# Altium footprint library HubProModel_v1.PcbLib: 67 footprints (part 4 of 5)
Each footprint in its own frame and in the unit in brackets; x right, y up, seen from the top. Pads: shape width x height; smd on the part's side, far side on the other; paste and mask are expansions set on the pad; w line width, h text height; cw(c..) or ccw(c..) is an arc to the next point about the centre after c.
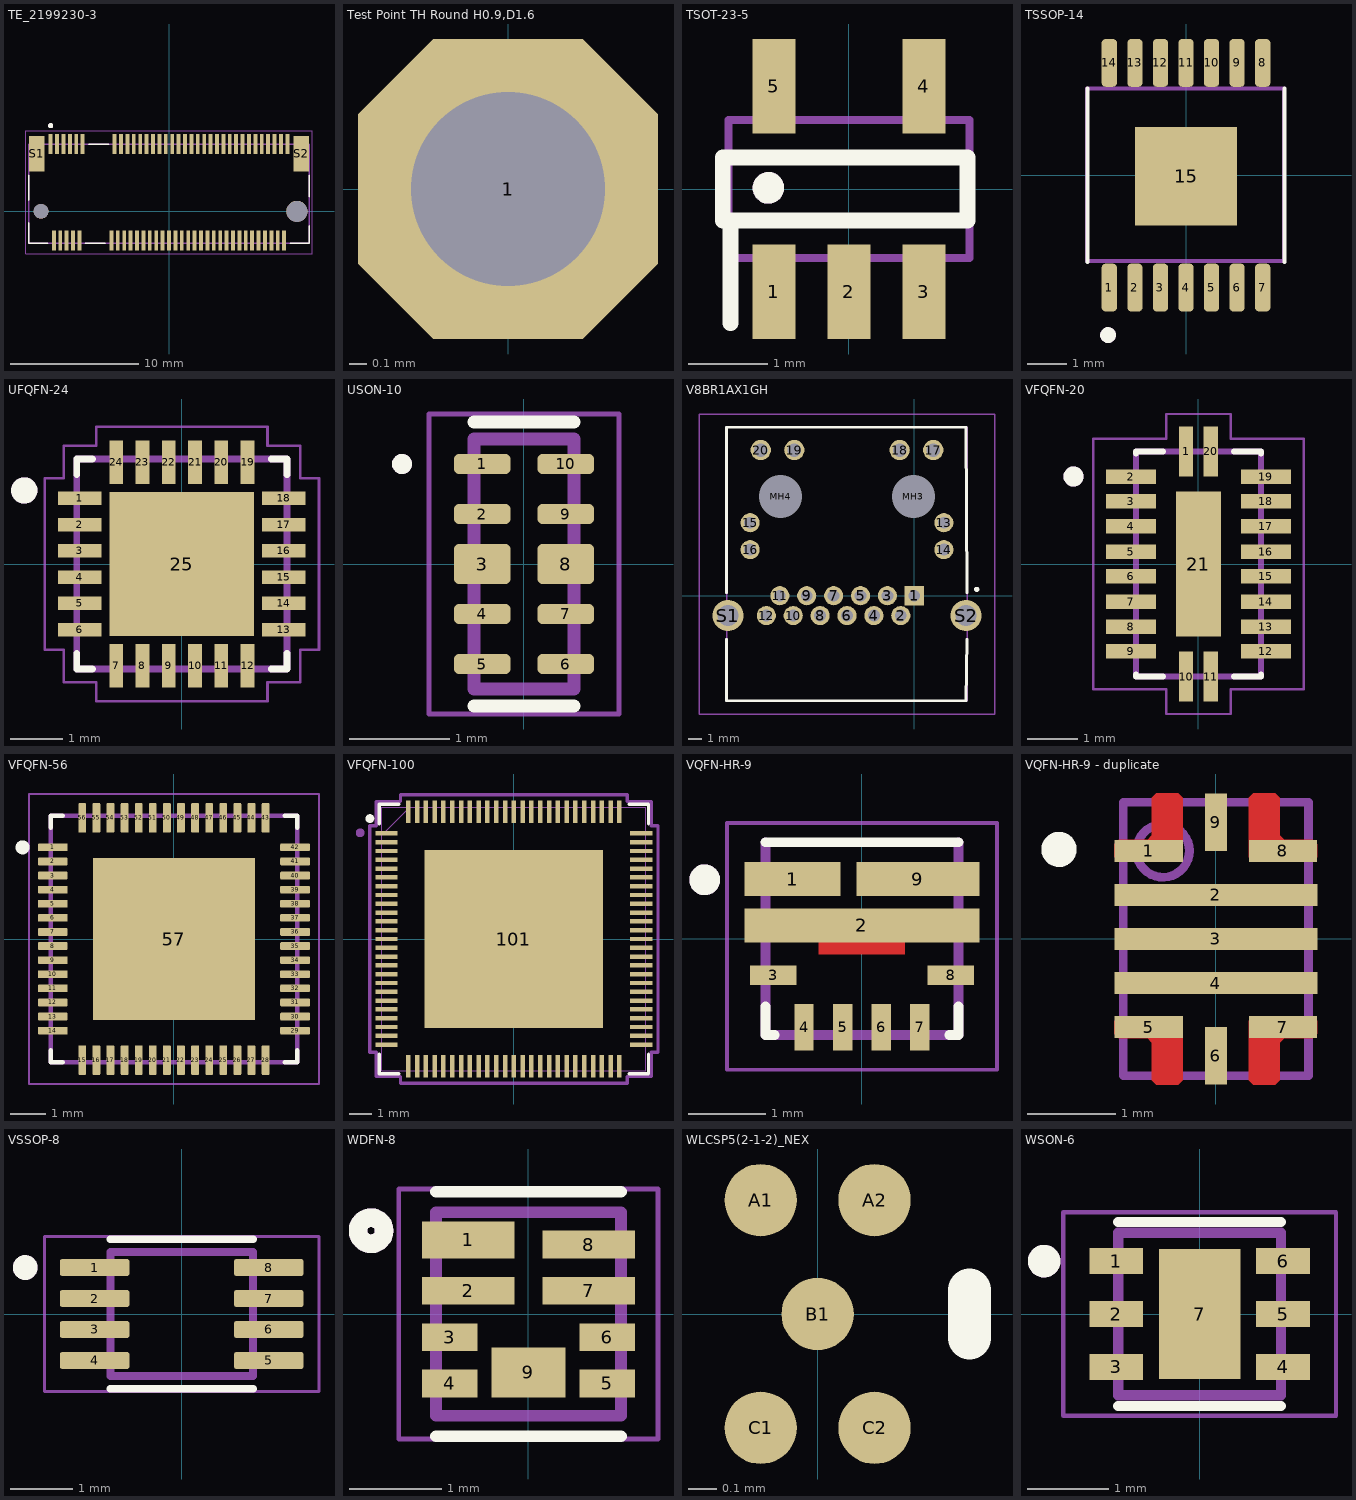
[diagram p3: the footprints below, top view; thin cyan lines are the x and y axes]

## TE_2199230-3 [mm] "M.2 0.5PITCH 4.2H KEY B 15U'' AU"
pads (71):
  rect 0.3x1.55 smd: 1(-9.25,5.275) 2(-9,-2.275) 3(-8.75,5.275) 4(-8.5,-2.275) 5(-8.25,5.275) 6(-8,-2.275) 7(-7.75,5.275) 8(-7.5,-2.275) 9(-7.25,5.275) 10(-7,-2.275) 11(-6.75,5.275) 20(-4.5,-2.275) 21(-4.25,5.275) 22(-4,-2.275) 23(-3.75,5.275) 24(-3.5,-2.275) 25(-3.25,5.275) 26(-3,-2.275) 27(-2.75,5.275) 28(-2.5,-2.275) 29(-2.25,5.275) 30(-2,-2.275) 31(-1.75,5.275) 32(-1.5,-2.275) 33(-1.25,5.275) 34(-1,-2.275) 35(-0.75,5.275) 36(-0.5,-2.275) 37(-0.25,5.275) 38(0,-2.275) 39(0.25,5.275) 40(0.5,-2.275) 41(0.75,5.275) 42(1,-2.275) 43(1.25,5.275) 44(1.5,-2.275) 45(1.75,5.275) 46(2,-2.275) 47(2.25,5.275) 48(2.5,-2.275) 49(2.75,5.275) 50(3,-2.275) 51(3.25,5.275) 52(3.5,-2.275) 53(3.75,5.275) 54(4,-2.275) 55(4.25,5.275) 56(4.5,-2.275) 57(4.75,5.275) 58(5,-2.275) 59(5.25,5.275) 60(5.5,-2.275) 61(5.75,5.275) 62(6,-2.275) 63(6.25,5.275) 64(6.5,-2.275) 65(6.75,5.275) 66(7,-2.275) 67(7.25,5.275) 68(7.5,-2.275) 69(7.75,5.275) 70(8,-2.275) 71(8.25,5.275) 72(8.5,-2.275) 73(8.75,5.275) 74(9,-2.275) 75(9.25,5.275)
  rect 1.2x2.75 smd: S1(-10.35,4.5) S2(10.35,4.5)
  round 1.15 hole 1.15 unplated: ""(-10,0)
  round 1.65 hole 1.65 unplated: ""(10,0)
Top Overlay:
  circle w0.2: c-9.25,6.7 r0.1
  lines w0.127: -10.95,-0.895 -10.95,-2.5 -9.47,-2.5 ; -10.95,0.895 -10.95,2.805 ; -6.53,-2.5 -4.97,-2.5 ; -6.28,5.25 -4.72,5.25 ; 9.47,-2.5 10.95,-2.5 10.95,-1.145 ; 10.95,1.145 10.95,2.805
Mechanical 13:
  circle w0.2: c-9.25,6.7 r0.1
  lines w0.127: -10.95,-2.5 10.95,-2.5 10.95,5.25 -10.95,5.25 -10.95,-2.5
Mechanical 15:
  lines w0.05: -11.2,-3.3 11.2,-3.3 11.2,6.3 -11.2,6.3 -11.2,-3.3

## Test Point TH Round H0.9,D1.6 [mm]
pads (1):
  oct 1.7x1.7 hole 1.1: 1(0,0)

## TSOT-23-5 [mm] "Buck Switching Regulator IC Positive Adjustable 0.6V 1 Output 700mA SOT-23-5 Thin, TSOT-23-5"
pads (5):
  rect 0.55x1.2 smd: 1(-0.95,-1.3) 2(0,-1.3) 3(0.95,-1.3) 4(0.95,1.3) 5(-0.95,1.3)
Top Overlay:
  circle w0.2: c-1.021,0.015 r0.1
  lines w0.2: -1.5,-1.7 -1.5,-0.4 ; -1.5,-0.4 1.5,-0.4 1.5,0.4 -1.6,0.4 -1.6,-0.4 -1.5,-0.4
Mechanical 13:
  circle w0.2: c-1.021,0.015 r0.1
  region: -0.7,-1.5 -1.2,-1.5 -1.2,-0.85 -0.7,-0.85
  region: 0.25,-1.5 -0.25,-1.5 -0.25,-0.85 0.25,-0.85
  region: 1.2,-1.5 0.7,-1.5 0.7,-0.85 1.2,-0.85
  region: 1.2,0.85 0.7,0.85 0.7,1.5 1.2,1.5
  region: -0.7,0.85 -1.2,0.85 -1.2,1.5 -0.7,1.5
  lines w0.1: -1.525,-0.875 1.525,-0.875 1.525,0.875 -1.525,0.875 -1.525,-0.875

## TSSOP-14 [mm] "Buck Switching Regulator IC Positive Adjustable 0.6V 1 Output 3A 14-TSSOP (0.173\", 4.40mm Width) Exposed Pad"
height 0.89
pads (15):
  rrect50% 0.387x1.215 smd: 1(-1.95,-2.857) 2(-1.3,-2.857) 3(-0.65,-2.857) 4(0,-2.857) 5(0.65,-2.857) 6(1.3,-2.857) 7(1.95,-2.857) 8(1.95,2.857) 9(1.3,2.857) 10(0.65,2.857) 11(0,2.857) 12(-0.65,2.857) 13(-1.3,2.857) 14(-1.95,2.857)
  rect 2.6x2.5 smd: 15(0,-0.025)
Top Overlay:
  circle w0.2: c-1.981,-4.064 r0.1
  lines w0.102: -2.5,-2.2 -2.5,2.2 ; 2.5,-2.2 2.5,2.2
Mechanical 1:
  circle w0.2: c-1.981,-4.064 r0.1
  lines w0.102: -2.515,-2.184 -2.515,2.21 2.489,2.21 2.489,-2.184 -2.515,-2.184

## UFQFN-24 [mm] "High Speed/Super Speed Type-C DRP Port Controller 3.3V/5V Tray 24-Pin QFN EP"
pads (25):
  rect 0.83x0.26 smd: 1(-1.94,1.25) 2(-1.94,0.75) 3(-1.94,0.25) 4(-1.94,-0.25) 5(-1.94,-0.75) 6(-1.94,-1.25) 13(1.94,-1.25) 14(1.94,-0.75) 15(1.94,-0.25) 16(1.94,0.25) 17(1.94,0.75) 18(1.94,1.25)
  rect 0.26x0.83 smd: 7(-1.25,-1.94) 8(-0.75,-1.94) 9(-0.25,-1.94) 10(0.25,-1.94) 11(0.75,-1.94) 12(1.25,-1.94) 19(1.25,1.94) 20(0.75,1.94) 21(0.25,1.94) 22(-0.25,1.94) 23(-0.75,1.94) 24(-1.25,1.94)
  rect 2.75x2.75 smd paste-2: 25(0,0)
Top Overlay:
  circle w0.3: c-3,1.4 r0.1
  lines w0.127: -2,-1.7 -2,-2 -1.7,-2 ; -2,1.7 -2,2 -1.7,2 ; 1.7,-2 2,-2 2,-1.7 ; 1.7,2 2,2 2,1.7
Top Paste:
  region: -0.135,0.135 -1.105,0.135 -1.105,1.105 -0.135,1.105
  region: -0.135,-1.105 -1.105,-1.105 -1.105,-0.135 -0.135,-0.135
  region: 1.105,-1.105 0.135,-1.105 0.135,-0.135 1.105,-0.135
  region: 1.105,0.135 0.135,0.135 0.135,1.105 1.105,1.105
Mechanical 13:
  circle w0.3: c-3,1.4 r0.1
  lines w0.127: -2,-2 2,-2 2,2 -2,2 -2,-2
Mechanical 15:
  lines w0.05: -2.61,-1.63 -2.25,-1.63 -2.25,-2.25 -1.63,-2.25 -1.63,-2.61 1.63,-2.61 1.63,-2.25 2.25,-2.25 2.25,-1.63 2.61,-1.63 2.61,1.63 2.25,1.63 2.25,2.25 1.63,2.25 1.63,2.61 -1.63,2.61 -1.63,2.25 -2.25,2.25 -2.25,1.63 -2.61,1.63 -2.61,-1.63

## USON-10 [mm] "Quad 0.8-pF, 5.5-V, ±8-kV ESD protection diode with 5-A 8/20-uS surge rating for USB 3.0"
height 13.32
pads (10):
  rrect50% 0.565x0.2 smd mask+0: 1(-0.417,1) 2(-0.417,0.5) 4(-0.417,-0.5) 5(-0.417,-1) 6(0.417,-1) 7(0.417,-0.5) 9(0.417,0.5) 10(0.417,1)
  rrect25% 0.565x0.4 smd paste-1 mask+0: 3(-0.417,0) 8(0.417,0)
Top Overlay:
  circle w0.1: c-1.22,1 r0.05
  lines w0.127: -0.5,-1.42 0.5,-1.42 ; -0.5,1.42 0.5,1.42
Top Paste:
  drawing of 2 lines, arcs and shapes, not listed
Top Solder:
  region: -0.065,0.83 -0.77,0.83 -0.77,1.17 -0.065,1.17
  region: -0.065,0.33 -0.77,0.33 -0.77,0.67 -0.065,0.67
  region: -0.065,-0.67 -0.77,-0.67 -0.77,-0.33 -0.065,-0.33
  region: -0.065,-1.17 -0.77,-1.17 -0.77,-0.83 -0.065,-0.83
  region: 0.77,0.83 0.065,0.83 0.065,1.17 0.77,1.17
  region: 0.77,0.33 0.065,0.33 0.065,0.67 0.77,0.67
  region: 0.77,-0.67 0.065,-0.67 0.065,-0.33 0.77,-0.33
  region: 0.77,-1.17 0.065,-1.17 0.065,-0.83 0.77,-0.83
  region: -0.065,-0.27 -0.77,-0.27 -0.77,0.27 -0.065,0.27
  region: 0.77,-0.27 0.065,-0.27 0.065,0.27 0.77,0.27
Mechanical 13:
  circle w0.1: c-1.22,1 r0.05
  lines w0.127: -0.5,-1.25 0.5,-1.25 0.5,1.25 -0.5,1.25 -0.5,-1.25
Mechanical 15:
  lines w0.05: -0.95,-1.5 0.95,-1.5 0.95,1.5 -0.95,1.5 -0.95,-1.5
3D body: height 0.5, standoff 0, extent -0.499,-1.249 0.499,1.249

## V8BR1AX1GH [mm] "1 Port RJ45 Magjack Connector Panel Mount, Through Hole 10/100/1000 Base-T, AutoMDIX, Power over Ethernet (PoE)"
pads (24):
  rect 1.446x1.446 hole 0.89: 1(0,0)
  round 1.446 hole 0.89: 2(-1.02,-1.5) 3(-2.03,0) 4(-3.05,-1.5) 5(-4.06,0) 6(-5.08,-1.5) 7(-6.09,0) 8(-7.11,-1.5) 9(-8.12,0) 10(-9.14,-1.5) 11(-10.15,0) 12(-11.17,-1.5) 13(2.235,5.51) 14(2.235,3.48) 15(-12.395,5.51) 16(-12.395,3.48)
  round 1.53 hole 1.02: 17(1.435,11) 18(-1.105,11) 19(-9.055,11) 20(-11.595,11)
  round 1.625 hole 3.25 unplated: MH3(-0.075,7.49) MH4(-10.085,7.49)
  round 2.355 hole 1.57: S1(-14.07,-1.5) S2(3.91,-1.5)
Top Overlay:
  lines w0.2: -14.175,-3.28 -14.175,-7.93 3.91,-7.93 3.985,-3.28 ; -14.175,0.22 -14.175,12.72 3.91,12.72 3.985,0.22 ; 4.615,0.477 ccw(c4.715,0.477) 4.815,0.477 ccw(c4.715,0.477) 4.615,0.477
Mechanical 15:
  lines w0.1: -14.175,-7.93 3.985,-7.93 3.985,12.72 -14.175,12.72 -14.175,-7.93
Mechanical 20:
  lines w0.1: -16.248,-8.93 6.088,-8.93 6.088,13.72 -16.248,13.72 -16.248,-8.93
3D body "V8BR-1AX1-GH.stp": height 16.97, standoff -3.25, extent -14.376,-7.925 4.216,12.725

## VFQFN-20 [mm] "DisplayPort, PCIe, USB Switch IC 2 Channel 20-DHVQFN (4.5x2.5)"
pads (21):
  rect 0.29x1 smd paste-0.025: 1(-0.25,2.25) 10(-0.25,-2.25) 11(0.25,-2.25) 20(0.25,2.25)
  rect 1x0.29 smd paste-0.025: 2(-1.35,1.75) 3(-1.35,1.25) 4(-1.35,0.75) 5(-1.35,0.25) 6(-1.35,-0.25) 7(-1.35,-0.75) 8(-1.35,-1.25) 9(-1.35,-1.75) 12(1.35,-1.75) 13(1.35,-1.25) 14(1.35,-0.75) 15(1.35,-0.25) 16(1.35,0.25) 17(1.35,0.75) 18(1.35,1.25) 19(1.35,1.75)
  rect 0.9x2.9 smd paste-2: 21(0,0)
Top Overlay:
  circle w0.2: c-2.5,1.75 r0.1
  lines w0.127: -1.25,-2.21 -1.25,-2.25 -0.71,-2.25 ; -1.25,2.21 -1.25,2.25 -0.71,2.25 ; 0.71,-2.25 1.25,-2.25 1.25,-2.21 ; 0.71,2.25 1.25,2.25 1.25,2.21
Top Paste:
  region: 0.2,-0.85 -0.2,-0.85 -0.2,-0.2 0.2,-0.2
  region: 0.2,0.2 -0.2,0.2 -0.2,0.85 0.2,0.85
Mechanical 13:
  circle w0.2: c-2.5,1.75 r0.1
  lines w0.127: -1.25,-2.25 -1.25,2.25 1.25,2.25 1.25,-2.25 -1.25,-2.25
Mechanical 15:
  lines w0.05: -2.1,-2.5 -2.1,2.5 -0.645,2.5 -0.645,3 0.645,3 0.645,2.5 2.1,2.5 2.1,-2.5 0.645,-2.5 0.645,-3 -0.645,-3 -0.645,-2.5 -2.1,-2.5

## VFQFN-56 [mm] "USB Hub Controller USB 2.0, USB 3.2 USB Interface 56-VQFN (7x7)"
pads (57):
  rrect25% 0.84x0.22 smd: 1(-3.435,2.6) 2(-3.435,2.2) 3(-3.435,1.8) 4(-3.435,1.4) 5(-3.435,1) 6(-3.435,0.6) 7(-3.435,0.2) 8(-3.435,-0.2) 9(-3.435,-0.6) 10(-3.435,-1) 11(-3.435,-1.4) 12(-3.435,-1.8) 13(-3.435,-2.2) 14(-3.435,-2.6) 29(3.435,-2.6) 30(3.435,-2.2) 31(3.435,-1.8) 32(3.435,-1.4) 33(3.435,-1) 34(3.435,-0.6) 35(3.435,-0.2) 36(3.435,0.2) 37(3.435,0.6) 38(3.435,1) 39(3.435,1.4) 40(3.435,1.8) 41(3.435,2.2) 42(3.435,2.6)
  rrect25% 0.22x0.84 smd: 15(-2.6,-3.435) 16(-2.2,-3.435) 17(-1.8,-3.435) 18(-1.4,-3.435) 19(-1,-3.435) 20(-0.6,-3.435) 21(-0.2,-3.435) 22(0.2,-3.435) 23(0.6,-3.435) 24(1,-3.435) 25(1.4,-3.435) 26(1.8,-3.435) 27(2.2,-3.435) 28(2.6,-3.435) 43(2.6,3.435) 44(2.2,3.435) 45(1.8,3.435) 46(1.4,3.435) 47(1,3.435) 48(0.6,3.435) 49(0.2,3.435) 50(-0.2,3.435) 51(-0.6,3.435) 52(-1,3.435) 53(-1.4,3.435) 54(-1.8,3.435) 55(-2.2,3.435) 56(-2.6,3.435)
  rect 4.6x4.6 smd paste-3: 57(0,0)
Top Overlay:
  circle w0.2: c-4.295,2.6 r0.1
  lines w0.127: -3.5,-3.15 -3.5,-3.5 -3.15,-3.5 ; -3.5,3.15 -3.5,3.5 -3.15,3.5 ; 3.15,-3.5 3.5,-3.5 3.5,-3.15 ; 3.15,3.5 3.5,3.5 3.5,3.15
Top Paste:
  region: 1.45,-1.45 -1.45,-1.45 -1.45,1.45 1.45,1.45
Mechanical 13:
  lines w0.127: -3.5,-3.5 -3.5,3.5 3.5,3.5 3.5,-3.5 -3.5,-3.5
Mechanical 15:
  lines w0.05: -4.115,-4.115 -4.115,4.115 4.115,4.115 4.115,-4.115 -4.115,-4.115

## VFQFN-100 [mil] "IC USB3.1 GEN2 HUB TYPE C"
height 35.04
pads (101):
  rect 40x8 smd paste+0 mask+0: 1(-228,188.98) 2(-228,173.23) 3(-228,157.48) 4(-228,141.73) 5(-228,125.98) 6(-228,110.24) 7(-228,94.49) 8(-228,78.74) 9(-228,62.99) 10(-228,47.24) 11(-228,31.5) 12(-228,15.75) 13(-228,0) 14(-228,-15.75) 15(-228,-31.5) 16(-228,-47.24) 17(-228,-62.99) 18(-228,-78.74) 19(-228,-94.49) 20(-228,-110.24) 21(-228,-125.98) 22(-228,-141.73) 23(-228,-157.48) 24(-228,-173.23) 25(-228,-188.98) 51(228,-188.98) 52(228,-173.23) 53(228,-157.48) 54(228,-141.73) 55(228,-125.98) 56(228,-110.24) 57(228,-94.49) 58(228,-78.74) 59(228,-62.99) 60(228,-47.24) 61(228,-31.5) 62(228,-15.75) 63(228,0) 64(228,15.75) 65(228,31.5) 66(228,47.24) 67(228,62.99) 68(228,78.74) 69(228,94.49) 70(228,110.24) 71(228,125.98) 72(228,141.73) 73(228,157.48) 74(228,173.23) 75(228,188.98)
  rect 8x40 smd paste+0 mask+0: 26(-188.98,-228) 27(-173.23,-228) 28(-157.48,-228) 29(-141.73,-228) 30(-125.98,-228) 31(-110.24,-228) 32(-94.49,-228) 33(-78.74,-228) 34(-62.99,-228) 35(-47.24,-228) 36(-31.5,-228) 37(-15.75,-228) 38(0,-228) 39(15.75,-228) 40(31.5,-228) 41(47.24,-228) 42(62.99,-228) 43(78.74,-228) 44(94.49,-228) 45(110.24,-228) 46(125.98,-228) 47(141.73,-228) 48(157.48,-228) 49(173.23,-228) 50(188.98,-228) 76(188.98,228) 77(173.23,228) 78(157.48,228) 79(141.73,228) 80(125.98,228) 81(110.24,228) 82(94.49,228) 83(78.74,228) 84(62.99,228) 85(47.24,228) 86(31.5,228) 87(15.75,228) 88(0,228) 89(-15.75,228) 90(-31.5,228) 91(-47.24,228) 92(-62.99,228) 93(-78.74,228) 94(-94.49,228) 95(-110.24,228) 96(-125.98,228) 97(-141.73,228) 98(-157.48,228) 99(-173.23,228) 100(-188.98,228)
  rect 319x319 smd paste-159 mask+0: 101(0,0)
Top Overlay:
  circle w7.87: c-257.66,215.57 r3.94
  lines w6: -241,-206.08 -241,-241 -206.08,-241 ; -241,206.08 -241,241 -206.08,241 ; 206.08,-241 241,-241 241,-206.08 ; 206.08,241 241,241 241,206.08
Top Paste:
  region: 155.56,-110.27 110.27,-110.27 110.27,-155.56 155.56,-155.56
  region: 155.56,-57.1 110.27,-57.1 110.27,-102.4 155.56,-102.4
  region: 155.56,-3.94 110.27,-3.94 110.27,-49.23 155.56,-49.23
  region: 155.56,49.23 110.27,49.23 110.27,3.94 155.56,3.94
  region: 155.56,102.4 110.27,102.4 110.27,57.1 155.56,57.1
  region: 155.56,155.56 110.27,155.56 110.27,110.27 155.56,110.27
  region: 102.4,-110.27 57.1,-110.27 57.1,-155.56 102.4,-155.56
  region: 102.4,-57.1 57.1,-57.1 57.1,-102.4 102.4,-102.4
  region: 102.4,-3.94 57.1,-3.94 57.1,-49.23 102.4,-49.23
  region: 102.4,49.23 57.1,49.23 57.1,3.94 102.4,3.94
  region: 102.4,102.4 57.1,102.4 57.1,57.1 102.4,57.1
  region: 102.4,155.56 57.1,155.56 57.1,110.27 102.4,110.27
  region: 49.23,-110.27 3.94,-110.27 3.94,-155.56 49.23,-155.56
  region: 49.23,-57.1 3.94,-57.1 3.94,-102.4 49.23,-102.4
  region: 49.23,-3.94 3.94,-3.94 3.94,-49.23 49.23,-49.23
  region: 49.23,49.23 3.94,49.23 3.94,3.94 49.23,3.94
  region: 49.23,102.4 3.94,102.4 3.94,57.1 49.23,57.1
  region: 49.23,155.56 3.94,155.56 3.94,110.27 49.23,110.27
  region: -3.94,-110.27 -49.23,-110.27 -49.23,-155.56 -3.94,-155.56
  region: -3.94,-57.1 -49.23,-57.1 -49.23,-102.4 -3.94,-102.4
  region: -3.94,-3.94 -49.23,-3.94 -49.23,-49.23 -3.94,-49.23
  region: -3.94,49.23 -49.23,49.23 -49.23,3.94 -3.94,3.94
  region: -3.94,102.4 -49.23,102.4 -49.23,57.1 -3.94,57.1
  region: -3.94,155.56 -49.23,155.56 -49.23,110.27 -3.94,110.27
  region: -57.1,-110.27 -102.4,-110.27 -102.4,-155.56 -57.1,-155.56
  region: -57.1,-57.1 -102.4,-57.1 -102.4,-102.4 -57.1,-102.4
  region: -57.1,-3.94 -102.4,-3.94 -102.4,-49.23 -57.1,-49.23
  region: -57.1,49.23 -102.4,49.23 -102.4,3.94 -57.1,3.94
  region: -57.1,102.4 -102.4,102.4 -102.4,57.1 -57.1,57.1
  region: -57.1,155.56 -102.4,155.56 -102.4,110.27 -57.1,110.27
  region: -110.27,-110.27 -155.56,-110.27 -155.56,-155.56 -110.27,-155.56
  region: -110.27,-57.1 -155.56,-57.1 -155.56,-102.4 -110.27,-102.4
  region: -110.27,-3.94 -155.56,-3.94 -155.56,-49.23 -110.27,-49.23
  region: -110.27,49.23 -155.56,49.23 -155.56,3.94 -110.27,3.94
  region: -110.27,102.4 -155.56,102.4 -155.56,57.1 -110.27,57.1
  region: -110.27,155.56 -155.56,155.56 -155.56,110.27 -110.27,110.27
Mechanical 13:
  drawing of 206 lines, arcs and shapes, not listed
Mechanical 15:
  lines w6: -258,-202.98 -258,202.98 -246,202.98 -246,246 -202.98,246 -202.98,258 202.98,258 202.98,246 246,246 246,202.98 258,202.98 258,-202.98 246,-202.98 246,-246 202.98,-246 202.98,-258 -202.98,-258 -202.98,-246 -246,-246 -246,-202.98 -258,-202.98
3D body "VQFN100_KDX_MCH.step": height 35.12, standoff 0, extent -235.98,-235.98 235.98,235.98

## VQFN-HR-9 [mm] "8-A valley current, 5.1-V fixed output voltage synchronous boost converters"
pads (9):
  rect 1.24x0.44 smd paste-2 mask+0: 1(-0.9,0.77)
  rect 3.04x0.44 smd paste-3 mask+0: 2(0,0.17)
  rect 0.6x0.25 smd mask+0: 3(-1.15,-0.475) 8(1.15,-0.475)
  rect 0.25x0.6 smd mask+0: 4(-0.75,-1.15) 5(-0.25,-1.15) 6(0.25,-1.15) 7(0.75,-1.15)
  rect 1.59x0.44 smd paste-2 mask+0: 9(0.725,0.77)
Top Layer:
  region: 0.557,-0.2 -0.559,-0.2 -0.559,-0.04 0.557,-0.04
Top Overlay:
  circle w0.2: c-2.038,0.762 r0.1
  lines w0.127: -1.25,-0.88 -1.25,-1.25 -1.13,-1.25 ; -1.25,1.25 1.25,1.25 ; 1.13,-1.25 1.25,-1.25 1.25,-0.88
Top Paste:
  region: -0.71,0.02 -1.453,0.02 -1.453,0.32 -0.71,0.32
  region: 0.49,-0.13 -0.491,-0.13 -0.491,0.32 0.49,0.32
  region: 1.45,0.02 0.712,0.02 0.712,0.32 1.45,0.32
  region: 1.45,0.621 0.852,0.621 0.852,0.92 1.45,0.92
  region: 0.65,0.621 0,0.621 0,0.92 0.65,0.92
  region: -0.5,0.621 -1.452,0.621 -1.452,0.92 -0.5,0.92
Top Solder:
  region: 1.52,-0.671 0.781,-0.671 0.781,-0.28 1.52,-0.28
  region: 0.945,-1.523 0.556,-1.523 0.556,-0.78 0.945,-0.78
  region: 0.445,-1.525 0.055,-1.525 0.055,-0.78 0.445,-0.78
  region: -0.055,-1.522 -0.446,-1.522 -0.446,-0.78 -0.055,-0.78
  region: -0.555,-1.522 -0.947,-1.522 -0.947,-0.78 -0.555,-0.78
  region: -0.78,-0.672 -1.524,-0.672 -1.524,-0.28 -0.78,-0.28
  region: 0.487,-0.13 -0.489,-0.13 -0.489,0.02 0.487,0.02
  region: 1.45,0.02 -1.453,0.02 -1.453,0.32 1.45,0.32
  region: 1.45,0.622 0,0.622 0,0.92 1.45,0.92
  region: -0.35,0.621 -1.452,0.621 -1.452,0.92 -0.35,0.92
Mechanical 13:
  circle w0.2: c-2.038,0.762 r0.1
  lines w0.127: -1.25,1.25 -1.25,-1.25 1.25,-1.25 1.25,1.25
  text "> VALUE" at -1.412,-3.035 h1.27
Mechanical 15:
  lines w0.05: -1.75,-1.7 -1.75,1.5 1.75,1.5 1.75,-1.7 -1.75,-1.7

## VQFN-HR-9 - duplicate [mm] "Automotive 2.75-V to 6-V, 2-A step-down converter in a 2mm x 3mm wettable-flanks QFN package"
pads (9):
  rect 0.775x0.25 smd paste-0.375 mask+0.051: 1(-0.761,1) 5(-0.761,-1) 7(0.761,-1) 8(0.761,1)
  rect 2.3x0.25 smd paste-1.137 mask+0.051: 2(0,0.5) 3(0,0) 4(0,-0.5)
  rect 0.25x0.65 smd paste+0 mask+0.051: 6(0,-1.325) 9(0,1.325)
Top Layer:
  region: -1.1,0.875 -1.15,0.925 -1.15,1.075 -1.1,1.125 -0.775,1.125 -0.725,1.175 -0.725,1.6 -0.675,1.65 -0.425,1.65 -0.375,1.6 -0.375,0.925 -0.425,0.875
  region: 0.425,0.875 0.375,0.925 0.375,1.6 0.425,1.65 0.675,1.65 0.725,1.6 0.725,1.175 0.775,1.125 1.1,1.125 1.15,1.075 1.15,0.925 1.1,0.875
  region: 0.375,-0.925 0.375,-1.6 0.425,-1.65 0.675,-1.65 0.725,-1.6 0.725,-1.175 0.775,-1.125 1.1,-1.125 1.15,-1.075 1.15,-0.925 1.1,-0.875 0.425,-0.875
  region: -0.775,-1.125 -1.1,-1.125 -1.15,-1.075 -1.15,-0.925 -1.1,-0.875 -0.425,-0.875 -0.375,-0.925 -0.375,-1.6 -0.425,-1.65 -0.675,-1.65 -0.725,-1.6 -0.725,-1.175
Top Overlay:
  circle w0.2: c-1.778,1.016 r0.1
Top Paste:
  drawing of 10 lines, arcs and shapes, not listed
Top Solder:
  drawing of 4 lines, arcs and shapes, not listed
Mechanical 13:
  circle w0.1: c-0.6,1 r0.3
  lines w0.1: -1.05,-1.55 -1.05,1.55 1.05,1.55 1.05,-1.55 -1.05,-1.55

## VSSOP-8 [mm] "0.9-? on-state resistance, 5-V, 1:1 (SPST), 2-channel analog switch (active high)"
pads (8):
  rrect25% 1.12x0.27 smd: 1(-1.405,0.75) 2(-1.405,0.25) 3(-1.405,-0.25) 4(-1.405,-0.75) 5(1.405,-0.75) 6(1.405,-0.25) 7(1.405,0.25) 8(1.405,0.75)
Top Overlay:
  circle w0.2: c-2.525,0.75 r0.1
  lines w0.127: -1.15,-1.205 1.15,-1.205 ; -1.15,1.205 1.15,1.205
Mechanical 13:
  circle w0.2: c-2.525,0.75 r0.1
  lines w0.127: -1.15,-1 -1.15,1 1.15,1 1.15,-1 -1.15,-1
Mechanical 15:
  lines w0.05: -2.215,-1.25 -2.215,1.25 2.215,1.25 2.215,-1.25 -2.215,-1.25
3D body "step_temp.STEP": height 0.9, standoff 0, extent -1.55,-1 1.55,1

## WDFN-8 [mm] "EMI2121MTTAG, Triple Bi-Directional ESD Protection Array, 8-Pin WDFN, EMI Series"
pads (9):
  rect 1x0.4 smd: 1(-0.65,0.8)
  rect 1x0.3 smd: 2(-0.65,0.25) 7(0.65,0.25) 8(0.65,0.75)
  rect 0.6x0.3 smd: 3(-0.85,-0.25) 4(-0.85,-0.75) 5(0.85,-0.75) 6(0.85,-0.25)
  rect 0.8x0.54 smd: 9(0,-0.63)
Top Overlay:
  circle w0.2: c-1.7,0.9 r0.141
  lines w0.127: -1,-1.32 1,-1.32 ; -1,1.32 1,1.32
Mechanical 13:
  circle w0.2: c-1.7,0.9 r0.141
  lines w0.127: -1,-1.1 1,-1.1 1,1.1 -1,1.1 -1,-1.1
Mechanical 15:
  lines w0.05: -1.4,-1.35 1.4,-1.35 1.4,1.35 -1.4,1.35 -1.4,-1.35
3D body "step_temp.STEP": height 0.8, standoff 0, extent -1,-1.1 1,1.1

## WLCSP5(2-1-2)_NEX [mil] "FLT, SMT, WLCSP5, Common Mode EMI Filters"
height 35.04
pads (5):
  round 10 smd paste+0 mask+0: A1(-7.87,15.75) A2(7.87,15.75) B1(0,0) C1(-7.87,-15.75) C2(7.87,-15.75)
Top Overlay:
  lines w6: 21,-3.29 21,3.29
3D body "PCMF1USB3SZ.STEP": height 17.04, standoff -8.16, extent -15.31,-23.03 15,23.03

## WSON-6 [mm] "75mA - 1.5A, adjustable ILIMIT, 2.5-6.5V, high enable, power switch, 85 mOhm 6-WSON -40 to 85"
pads (7):
  rect 0.66x0.32 smd: 1(-1.025,0.65) 2(-1.025,0) 3(-1.025,-0.65) 4(1.025,-0.65) 5(1.025,0) 6(1.025,0.65)
  rect 1x1.6 smd paste-2: 7(0,0)
Top Overlay:
  circle w0.2: c-1.91,0.65 r0.1
  lines w0.127: -1,-1.13 1,-1.13 ; -1,1.13 1,1.13
Top Paste:
  region: 0.316,-0.506 -0.316,-0.506 -0.316,0.506 0.316,0.506
Mechanical 13:
  circle w0.2: c-1.91,0.65 r0.1
  lines w0.127: -1,-1 -1,1 1,1 1,-1 -1,-1
Mechanical 15:
  lines w0.05: -1.675,-1.25 -1.675,1.25 1.675,1.25 1.675,-1.25 -1.675,-1.25